# Altium integrated library Lib31082020.IntLib: 205 symbols (part 1 of 2)
Pins are listed as number, name and electrical type; pins without a type are passive.

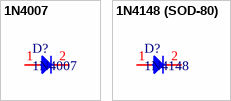
[diagram p0: symbols 1N4007 to 1N4148 (SOD-80)]

## 1N4007
designator D?
footprint DO-41
pins: 1, 2

## 1N4148 (SOD-80)
designator D?, comment 1N4148
footprint SOD-80
pins: 1, 2


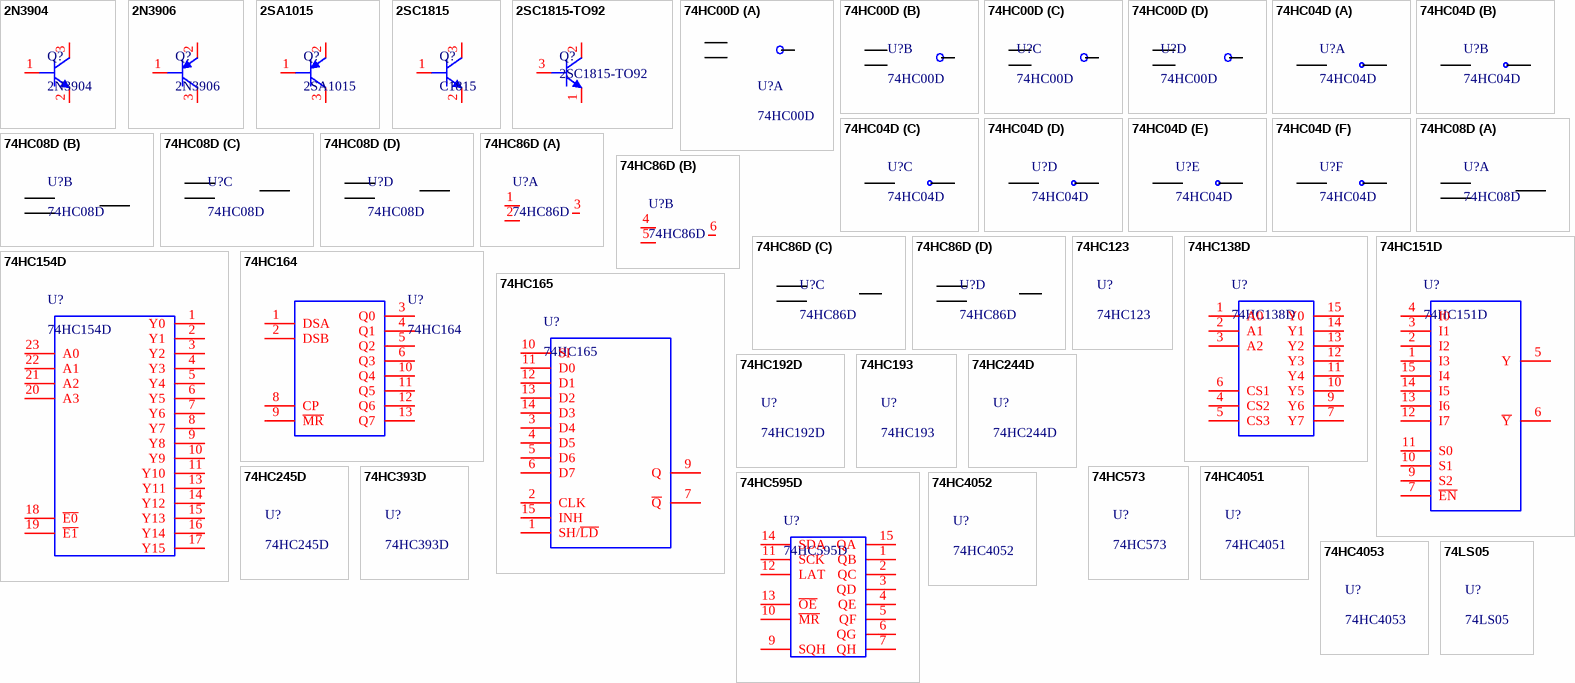
[diagram p1: symbols 2N3904 to 74LS05]

## 2N3904
designator Q?
footprint SOT23-3
footprint SOT223-3
pins: 1 B, 2 E, 3 C

## 2N3906
designator Q?
footprint SOT23-3
pins: 1 B, 2 E, 3 C

## 2SA1015
designator Q?
footprint SOT23-3
pins: 1 B, 2 E, 3 C

## 2SC1815
designator Q?, comment C1815
footprint SOT23-3
pins: 1 B, 2 E, 3 C

## 2SC1815-TO92
designator Q?
footprint TO-92
pins: 1 E, 2 C, 3 B

## 74HC00D
designator U?
footprint SO14
part A pins: 1, 2, 3, 7 hidden to GND, 14 hidden to VCC
part B pins: 4, 5, 6
part C pins: 8, 9, 10
part D pins: 11, 12, 13

## 74HC04D
designator U?
footprint SO14
part A pins: 1, 2, 7 hidden to GND, 14 hidden to VCC
part B pins: 3, 4
part C pins: 5, 6
part D pins: 8, 9
part E pins: 10, 11
part F pins: 12, 13

## 74HC08D
designator U?
footprint SO14
part A pins: 1, 2, 3
part B pins: 4, 5, 6, 7 hidden to GND, 14 hidden to VCC
part C pins: 8, 9, 10
part D pins: 11, 12, 13

## 74HC86D
designator U?
footprint SO14
part A pins: 1, 2, 3, 7 hidden to GND, 14 hidden to VCC
part B pins: 4, 5, 6
part C pins: 8, 9, 10
part D pins: 11, 12, 13

## 74HC123
designator U?
footprint SO16

## 74HC138D
designator U?
footprint SO16
pins: 1 A0, 2 A1, 3 A2, 4 CS2, 5 CS3, 6 CS1, 7 Y7, 8 hidden to GND, 9 Y6, 10 Y5, 11 Y4, 12 Y3, 13 Y2, 14 Y1, 15 Y0, 16 hidden to VCC

## 74HC151D
designator U?
footprint SO16
pins: 1 I3, 2 I2, 3 I1, 4 I0, 5 Y, 6 ~{Y}, 7 ~{EN}, 8 hidden to GND, 9 S2, 10 S1, 11 S0, 12 I7, 13 I6, 14 I5, 15 I4, 16 hidden to VCC

## 74HC154D
designator U?
footprint SO24
pins: 1 Y0, 2 Y1, 3 Y2, 4 Y3, 5 Y4, 6 Y5, 7 Y6, 8 Y7, 9 Y8, 10 Y9, 11 Y10, 12 hidden to GND, 13 Y11, 14 Y12, 15 Y13, 16 Y14, 17 Y15, 18 ~{E0}, 19 ~{E1}, 20 A3, 21 A2, 22 A1, 23 A0, 24 hidden to VCC

## 74HC164
designator U?
footprint SO14
pins: 1 DSA, 2 DSB, 3 Q0, 4 Q1, 5 Q2, 6 Q3, 7 hidden to GND, 8 CP, 9 ~{MR}, 10 Q4, 11 Q5, 12 Q6, 13 Q7, 14 hidden to VCC

## 74HC165
designator U?
footprint SO16
pins: 1 SH/~{LD}, 2 CLK, 3 D4, 4 D5, 5 D6, 6 D7, 7 ~{Q}, 8 hidden to GND, 9 Q, 10 SI, 11 D0, 12 D1, 13 D2, 14 D3, 15 INH, 16 hidden to VCC

## 74HC192D
designator U?
footprint SO16

## 74HC193
designator U?
footprint SO16

## 74HC244D
designator U?
footprint SO20

## 74HC245D
designator U?
footprint SOIC20_1.27_7.5

## 74HC393D
designator U?
footprint SO14

## 74HC573
designator U?
footprint SO20

## 74HC595D
designator U?
footprint SO16
pins: 1 QB, 2 QC, 3 QD, 4 QE, 5 QF, 6 QG, 7 QH, 8 hidden to GND, 9 SQH "OUTPUT", 10 ~{MR} "OUTPUT", 11 SCK "OUTPUT", 12 LAT "OUTPUT", 13 ~{OE} "OUTPUT", 14 SDA "OUTPUT", 15 QA, 16 hidden to VCC

## 74HC4051
designator U?
footprint SO16

## 74HC4052
designator U?
footprint SO16

## 74HC4053
designator U?
footprint SO16

## 74LS05
designator U?
footprint SO14

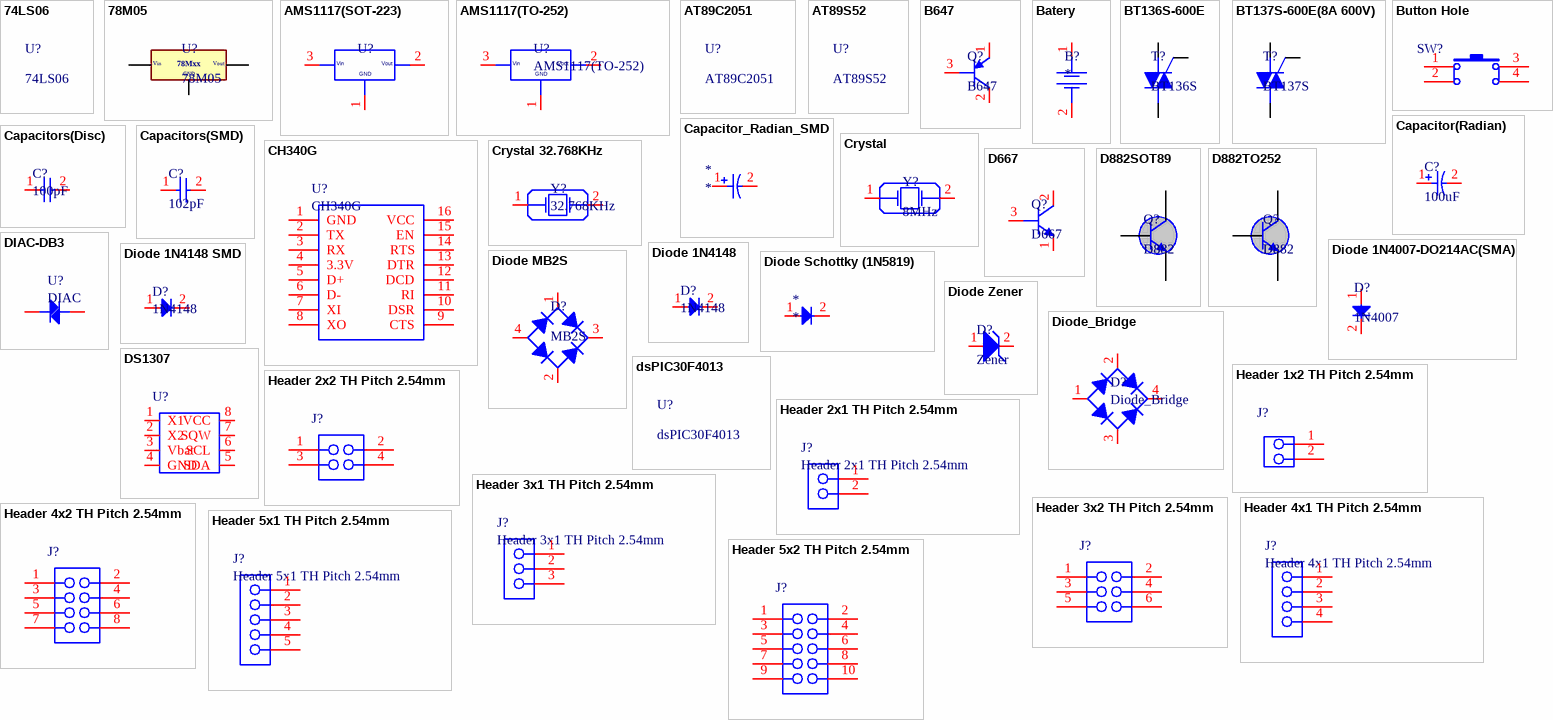
[diagram p2: symbols 74LS06 to Header 5x2 TH Pitch 2.54mm]

## 74LS06
designator U?
footprint SO14

## 78M05
designator U?
pins: 1, 2, 3
text: Vin; Vout; 78Mxx; GND

## AMS1117(SOT-223)
designator U?, comment AMS1117  (value not drawn)
footprint SOT223-3
pins: 1, 2, 3
text: Vin; Vout; GND

## AMS1117(TO-252)
designator U?
footprint TO252-3
pins: 1, 2, 3
text: Vin; Vout; GND

## AT89C2051
designator U?
footprint SOP20

## AT89S52
designator U?
footprint TQFP44_0.8_10

## B647
designator Q?
footprint TO-92
pins: 1 E, 2 C, 3 B

## Batery
designator B?
footprint CR1220
pins: 1, 2

## BT136S-600E
designator T?, comment BT136S
footprint TO252-3
pins: 1 T1, 2 T2, 3 G

## BT137S-600E(8A 600V)
designator T?, comment BT137S
footprint TO252-3
pins: 1 T1, 2 T2, 3 G

## Button Hole
designator SW?  (value not drawn)
footprint BUTTON_HOLE_4.3mm
footprint BUTTON_HOLE_5.0mm
footprint BUTTON_HOLE_7.0mm
footprint BUTTON_HOLE_7.3mm
footprint BUTTON_HOLE_7.5mm
footprint BUTTON_HOLE_8.0mm
footprint BUTTON_HOLE_9.5mm
footprint BUTTON_HOLE_11.0mm
footprint BUTTON_HOLE_12.0mm
footprint BUTTON_HOLE_13.0mm
footprint BUTTON_HOLE_15.0mm
footprint BUTTON_HOLE_17.0mm
footprint BUTTON_HOLE_18.0mm
footprint BUTTON_HOLE_20.0mm
footprint BUTTON_HOLE_22.0mm
footprint BUTTON_HOLE_26.0mm
pins: 1, 2, 3, 4

## Capacitor(Radian)
designator C?, comment 100uF
footprint CAP_6.3_100uF
footprint CAP_RAD_D5x11_POL_BK
footprint CAP_RAD_D6.3x11_POL_BK
footprint CAP_RAD_D8x11.5_POL_BK
footprint CAP_RAD_4mm
footprint CAP_RAD_7mm
footprint CAP_RAD_6mm
pins: 1, 2

## Capacitor_Radian_SMD
designator *
pins: 1, 2

## Capacitors(Disc)
designator C?, comment 100pF
footprint CAP_DISC_PITCH_2.54MM
pins: 1, 2

## Capacitors(SMD)
designator C?, comment 102pF
footprint C0201
footprint C0402
footprint C0603
footprint C0805
footprint C1206
footprint C1808
footprint C1812
pins: 1, 2

## CH340G
designator U?
footprint SOP16_1.27_3.8
pins: 1 GND, 2 TX, 3 RX, 4 3.3V, 5 D+, 6 D-, 7 XI, 8 XO, 9 CTS, 10 DSR, 11 RI, 12 DCD, 13 DTR, 14 RTS, 15 EN, 16 VCC

## Crystal
designator Y?, comment 8MHz
footprint HC-49S
footprint HC-49_THROUGH
footprint SMD5032
pins: 1, 2

## Crystal 32.768KHz
designator Y?, comment 32.768KHz
footprint DT-26
pins: 1, 2

## D667
designator Q?
footprint TO-92
pins: 1 E, 2 C, 3 B

## D882SOT89
designator Q?, comment D882
footprint SOT-89
pins: 1 B, 2 C, 3 E

## D882TO252
designator Q?, comment D882
footprint TO252-3
pins: 1 B, 2 C, 3 E

## DIAC-DB3
designator U?, comment DIAC
footprint SOT23-3
pins: 1 4, 2

## Diode 1N4007-DO214AC(SMA)
designator D?, comment 1N4007
footprint DO-214AC(SMA)
pins: 1, 2

## Diode 1N4148
designator D?, comment 1N4148
footprint DO-35 Horizontal
footprint DO-35 Vertical
footprint SOD-80
pins: 1, 2

## Diode 1N4148 SMD
designator D?, comment 1N4148
footprint DO-213AB
pins: 1, 2

## Diode MB2S
designator D?, comment MB2S
footprint TO-269AA
pins: 1, 2, 3, 4

## Diode Schottky (1N5819)
designator *
footprint SOD-123_2.7
pins: 1, 2

## Diode Zener
designator D?, comment Zener
footprint DO-213AB
pins: 1 A, 2 K

## Diode_Bridge
designator D?
footprint DIODE_2A
pins: 1, 2, 3, 4

## DS1307
designator U?, comment RealTime  (value not drawn)
footprint SOIC08_1.27_6.0
pins: 1 X1, 2 X2, 3 Vbat, 4 GND, 5 SDA, 6 SCL, 7 SQW, 8 VCC

## dsPIC30F4013
designator U?
footprint TQFP44_0.8_10

## Header 1x2 TH Pitch 2.54mm
designator J?  (value not drawn)
footprint Header 2x1 TH Pitch 2.54mm
pins: 1, 2

## Header 2x1 TH Pitch 2.54mm
designator J?
footprint Header 2x1 TH Pitch 2.54mm
pins: 1, 2

## Header 2x2 TH Pitch 2.54mm
designator J?  (value not drawn)
footprint Header 2x2 TH Pitch 2.54mm
pins: 1, 2, 3, 4

## Header 3x1 TH Pitch 2.54mm
designator J?
footprint Header 3x1 TH Pitch 2.54mm
pins: 1, 2, 3

## Header 3x2 TH Pitch 2.54mm
designator J?  (value not drawn)
footprint Header 3x2 TH Pitch 2.54mm
pins: 1, 2, 3, 4, 5, 6

## Header 4x1 TH Pitch 2.54mm
designator J?
footprint Header 4x1 TH Pitch 2.54mm
pins: 1, 2, 3, 4

## Header 4x2 TH Pitch 2.54mm
designator J?  (value not drawn)
footprint Header 4x2 TH Pitch 2.54mm
pins: 1, 2, 3, 4, 5, 6, 7, 8

## Header 5x1 TH Pitch 2.54mm
designator J?
footprint Header 5x1 TH Pitch 2.54mm
pins: 1, 2, 3, 4, 5

## Header 5x2 TH Pitch 2.54mm
designator J?  (value not drawn)
footprint Header 5x2 TH Pitch 2.54mm
pins: 1, 2, 3, 4, 5, 6, 7, 8, 9, 10

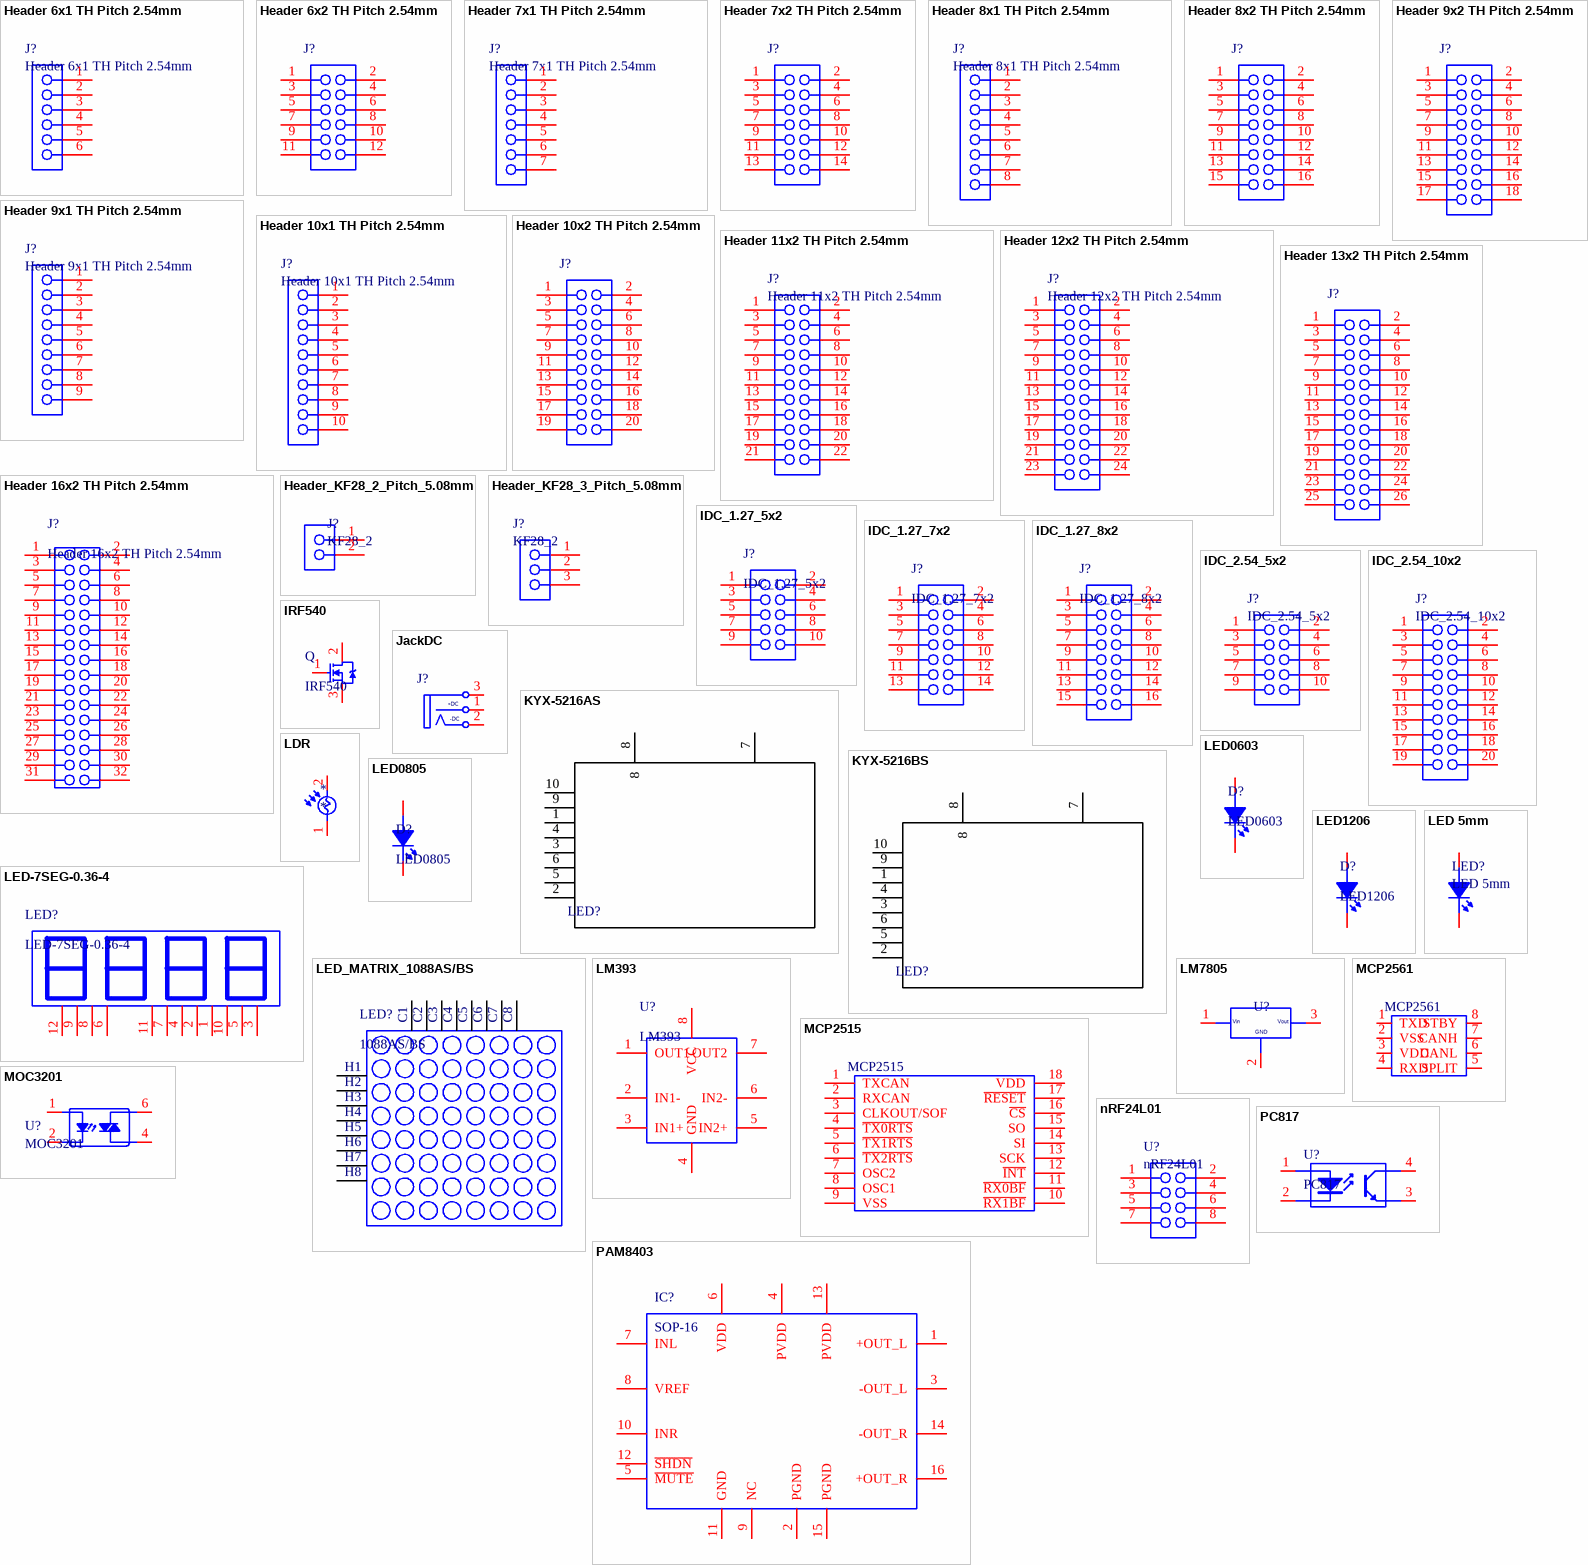
[diagram p3: symbols Header 6x1 TH Pitch 2.54mm to PC817]

## Header 6x1 TH Pitch 2.54mm
designator J?
footprint Header 6x1 TH Pitch 2.54mm
pins: 1, 2, 3, 4, 5, 6

## Header 6x2 TH Pitch 2.54mm
designator J?  (value not drawn)
footprint Header 6x2 TH Pitch 2.54mm
pins: 1, 2, 3, 4, 5, 6, 7, 8, 9, 10, 11, 12

## Header 7x1 TH Pitch 2.54mm
designator J?
footprint Header 7x1 TH Pitch 2.54mm
pins: 1, 2, 3, 4, 5, 6, 7

## Header 7x2 TH Pitch 2.54mm
designator J?  (value not drawn)
footprint Header 7x2 TH Pitch 2.54mm
pins: 1, 2, 3, 4, 5, 6, 7, 8, 9, 10, 11, 12, 13, 14

## Header 8x1 TH Pitch 2.54mm
designator J?
footprint Header 8x1 TH Pitch 2.54mm
pins: 1, 2, 3, 4, 5, 6, 7, 8

## Header 8x2 TH Pitch 2.54mm
designator J?  (value not drawn)
footprint Header 8x2 TH Pitch 2.54mm
pins: 1, 2, 3, 4, 5, 6, 7, 8, 9, 10, 11, 12, 13, 14, 15, 16

## Header 9x1 TH Pitch 2.54mm
designator J?
footprint Header 9x1 TH Pitch 2.54mm
pins: 1, 2, 3, 4, 5, 6, 7, 8, 9

## Header 9x2 TH Pitch 2.54mm
designator J?  (value not drawn)
footprint Header 9x2 TH Pitch 2.54mm
pins: 1, 2, 3, 4, 5, 6, 7, 8, 9, 10, 11, 12, 13, 14, 15, 16, 17, 18

## Header 10x1 TH Pitch 2.54mm
designator J?
footprint Header 10x1 TH Pitch 2.54mm
pins: 1, 2, 3, 4, 5, 6, 7, 8, 9, 10

## Header 10x2 TH Pitch 2.54mm
designator J?  (value not drawn)
footprint Header 10x2 TH Pitch 2.54mm
pins: 1, 2, 3, 4, 5, 6, 7, 8, 9, 10, 11, 12, 13, 14, 15, 16, 17, 18, 19, 20

## Header 11x2 TH Pitch 2.54mm
designator J?
footprint Header 11x2 TH Pitch 2.54mm
pins: 1, 2, 3, 4, 5, 6, 7, 8, 9, 10, 11, 12, 13, 14, 15, 16, 17, 18, 19, 20, 21, 22

## Header 12x2 TH Pitch 2.54mm
designator J?
footprint Header 12x2 TH Pitch 2.54mm
pins: 1, 2, 3, 4, 5, 6, 7, 8, 9, 10, 11, 12, 13, 14, 15, 16, 17, 18, 19, 20, 21, 22, 23, 24

## Header 13x2 TH Pitch 2.54mm
designator J?  (value not drawn)
footprint Header 13x2 TH Pitch 2.54mm
pins: 1, 2, 3, 4, 5, 6, 7, 8, 9, 10, 11, 12, 13, 14, 15, 16, 17, 18, 19, 20, 21, 22, 23, 24, 25, 26

## Header 16x2 TH Pitch 2.54mm
designator J?
footprint Header 16x2 TH Pitch 2.54mm
pins: 1, 2, 3, 4, 5, 6, 7, 8, 9, 10, 11, 12, 13, 14, 15, 16, 17, 18, 19, 20, 21, 22, 23, 24, 25, 26, 27, 28, 29, 30, 31, 32

## Header_KF28_2_Pitch_5.08mm
designator J?, comment KF28_2
footprint HEADER_KF128_2_5.08MM
pins: 1, 2

## Header_KF28_3_Pitch_5.08mm
designator J?, comment KF28_2
footprint HEADER_KF128_3_5.08MM
pins: 1, 2, 3

## IDC_1.27_5x2
designator J?
footprint CONB127P-2R-10W_TH
pins: 1, 2, 3, 4, 5, 6, 7, 8, 9, 10

## IDC_1.27_7x2
designator J?
footprint CONB127P-2R-14W_TH
pins: 1, 2, 3, 4, 5, 6, 7, 8, 9, 10, 11, 12, 13, 14

## IDC_1.27_8x2
designator J?
footprint CONB127P-2R-16W_TH
pins: 1, 2, 3, 4, 5, 6, 7, 8, 9, 10, 11, 12, 13, 14, 15, 16

## IDC_2.54_5x2
designator J?
footprint IDC_CONNECTOR_10x2.54
pins: 1, 2, 3, 4, 5, 6, 7, 8, 9, 10

## IDC_2.54_10x2
designator J?
footprint IDC_CONNECTOR_20_2.54
pins: 1, 2, 3, 4, 5, 6, 7, 8, 9, 10, 11, 12, 13, 14, 15, 16, 17, 18, 19, 20

## IRF540
designator Q
footprint TO263AB
pins: 1 G, 2 D, 3 S

## JackDC
designator J?, comment Connector  (value not drawn)
footprint DC_JACK_161-0721
footprint DC_K375A_Power
pins: 1 DS+ (power) "Sleeve (Ground)", 2 DC- "Tip Normal (Break Contact)", 3 T "Tip"
text: +DC; -DC

## KYX-5216AS
designator LED?  (value not drawn)
footprint KYX-5261AS/BS (0.56inch 2digits red 7 segment led display 10pin)
pins: 1, 2, 3, 4, 5, 6, 7, 8, 9, 10

## KYX-5216BS
designator LED?
footprint KYX-5261AS/BS (0.56inch 2digits red 7 segment led display 10pin)
pins: 1, 2, 3, 4, 5, 6, 7, 8, 9, 10

## LDR
designator *
footprint LDR_CELL_THRU_HOLE
pins: 1, 2

## LED0603
designator D?
footprint L0603BLUE
pins: 1 A, 2 K

## LED0805
designator D?
footprint L0805RED
pins: 1 A, 2 K

## LED1206
designator D?
footprint L1206BLUE
footprint L1206RED
pins: 1 A, 2 K

## LED 5mm
designator LED?
footprint LED_5MM
pins: 1 A, 2 K

## LED-7SEG-0.36-4
designator LED?
footprint LED-7SEG-0.36-4
pins: 1, 2, 3, 4, 5, 6, 7, 8, 9, 10, 11, 12

## LED_MATRIX_1088AS/BS
designator LED?, comment 1088AS/BS
footprint LED_MATRIX_1088AS/BS
pins: 1, 2, 3, 4, 5, 6, 7, 8, 9, 10, 11, 12, 13, 14, 15, 16
text: C1; C2; C3; C4; C5; C6; C7; C8; H1; H2; H3; H4; H5; H6; H7; H8

## LM393
designator U?
footprint SOIC08_1.27_6.0
pins: 1 OUT1, 2 IN1-, 3 IN1+, 4 GND, 5 IN2+, 6 IN2-, 7 OUT2, 8 VCC

## LM7805
designator U?  (value not drawn)
footprint TO252-3
pins: 1, 2, 3 2
text: Vin; Vout; GND

## MCP2515
designator MCP2515, comment Stand-Alone CAN Controller with SPI Interface  (value not drawn)
footprint SOIC18_1.27_7.5
pins: 1 TXCAN, 2 RXCAN, 3 CLKOUT/SOF, 4 ~{TX0RTS}, 5 ~{TX1RTS}, 6 ~{TX2RTS}, 7 OSC2, 8 OSC1, 9 VSS, 10 ~{RX1BF}, 11 ~{RX0BF}, 12 ~{INT}, 13 SCK, 14 SI, 15 SO, 16 ~{CS}, 17 ~{RESET}, 18 VDD

## MCP2561
designator MCP2561, comment High-Speed CAN Transceiver  (value not drawn)
footprint SOIC08_1.27_6.0
pins: 1 TXD, 2 VSS, 3 VDD, 4 RXD, 5 SPLIT, 6 CANL, 7 CANH, 8 STBY

## MOC3201
designator U?
footprint SOP-6
pins: 1, 2, 4, 6

## nRF24L01
designator U?
footprint nRF24L01
pins: 1, 2, 3, 4, 5, 6, 7, 8

## PAM8403
designator IC?, comment SOP-16
footprint SOP16_1.27_3.8
pins: 1 +OUT_L, 2 PGND, 3 -OUT_L, 4 PVDD, 5 ~{MUTE}, 6 VDD, 7 INL, 8 VREF, 9 NC, 10 INR, 11 GND, 12 ~{SHDN}, 13 PVDD, 14 -OUT_R, 15 PGND, 16 +OUT_R

## PC817
designator U?
footprint SOP-4
pins: 1 A "Anode", 2 K "Cathode", 3 E "Emitter", 4 C "Collector"

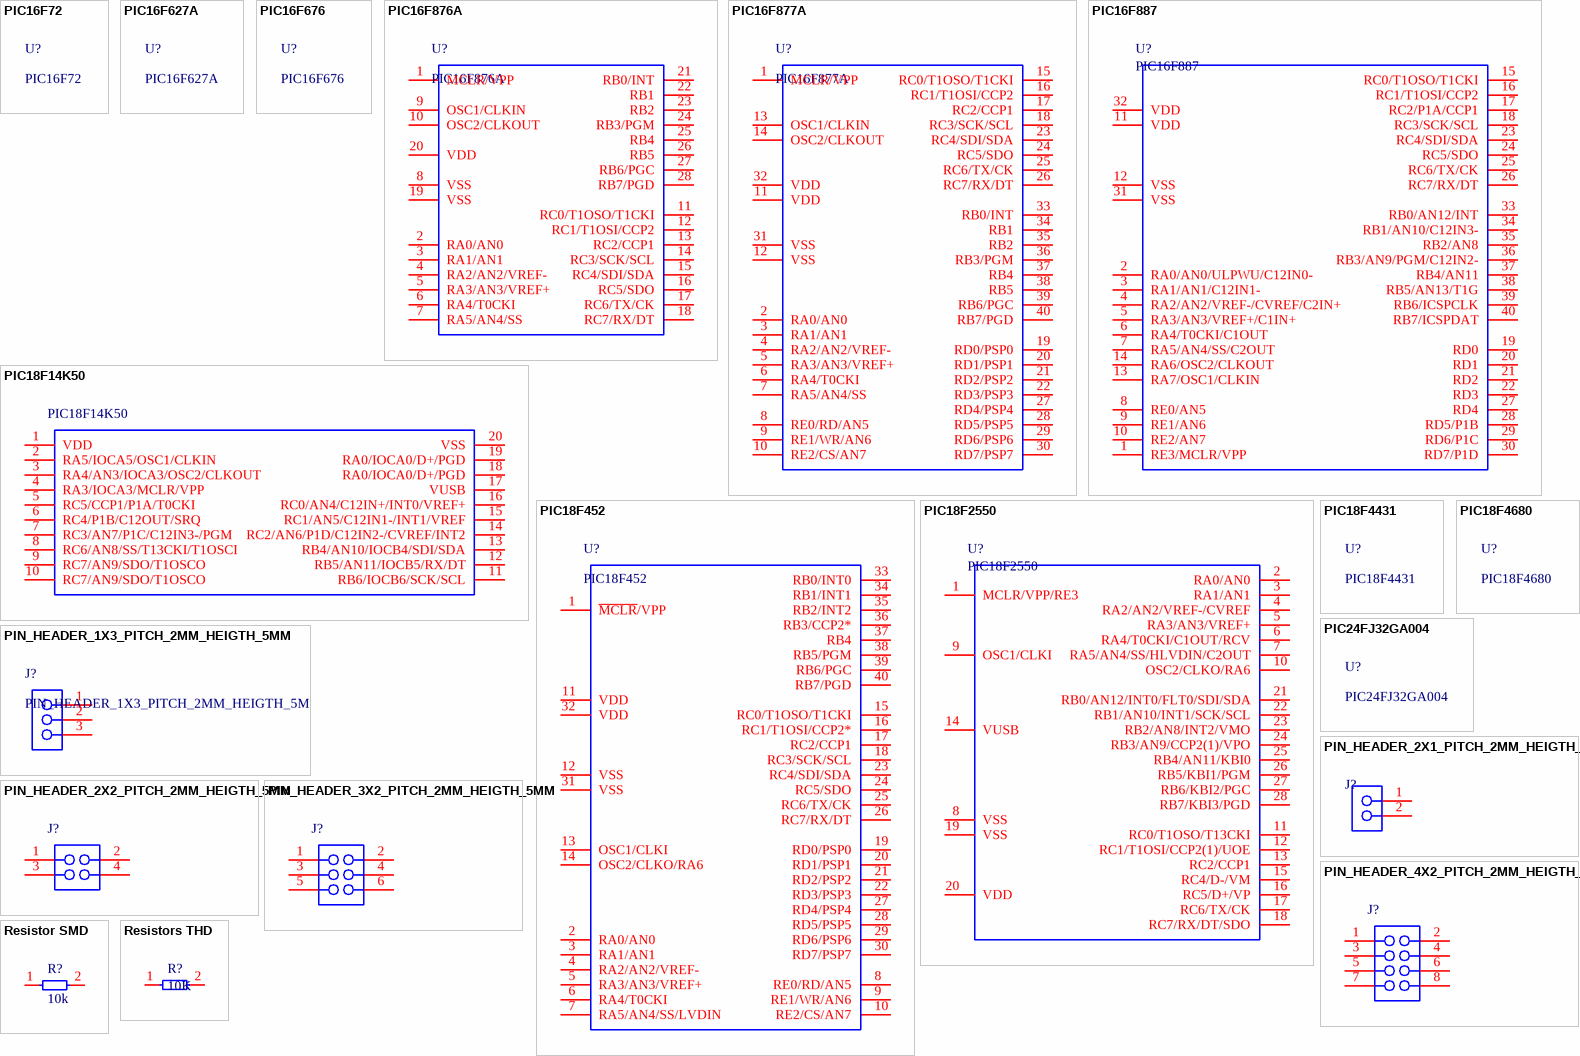
[diagram p4: symbols PIC16F72 to Resistors THD]

## PIC16F72
designator U?
footprint SSOP28

## PIC16F627A
designator U?

## PIC16F676
designator U?
footprint TSSOP14_0.65_4.4

## PIC16F876A
designator U?
footprint SSOP28
footprint DIP28_M04
pins: 1 MCLR/VPP, 2 RA0/AN0, 3 RA1/AN1, 4 RA2/AN2/VREF-, 5 RA3/AN3/VREF+, 6 RA4/T0CKI, 7 RA5/AN4/SS, 8 VSS, 9 OSC1/CLKIN, 10 OSC2/CLKOUT, 11 RC0/T1OSO/T1CKI, 12 RC1/T1OSI/CCP2, 13 RC2/CCP1, 14 RC3/SCK/SCL, 15 RC4/SDI/SDA, 16 RC5/SDO, 17 RC6/TX/CK, 18 RC7/RX/DT, 19 VSS, 20 VDD, 21 RB0/INT, 22 RB1, 23 RB2, 24 RB3/PGM, 25 RB4, 26 RB5, 27 RB6/PGC, 28 RB7/PGD

## PIC16F877A
designator U?
footprint DIP40_M02
pins: 1 MCLR/VPP, 2 RA0/AN0, 3 RA1/AN1, 4 RA2/AN2/VREF-, 5 RA3/AN3/VREF+, 6 RA4/T0CKI, 7 RA5/AN4/SS, 8 RE0/RD/AN5, 9 RE1/WR/AN6, 10 RE2/CS/AN7, 11 VDD, 12 VSS, 13 OSC1/CLKIN, 14 OSC2/CLKOUT, 15 RC0/T1OSO/T1CKI, 16 RC1/T1OSI/CCP2, 17 RC2/CCP1, 18 RC3/SCK/SCL, 19 RD0/PSP0, 20 RD1/PSP1, 21 RD2/PSP2, 22 RD3/PSP3, 23 RC4/SDI/SDA, 24 RC5/SDO, 25 RC6/TX/CK, 26 RC7/RX/DT, 27 RD4/PSP4, 28 RD5/PSP5, 29 RD6/PSP6, 30 RD7/PSP7, 31 VSS, 32 VDD, 33 RB0/INT, 34 RB1, 35 RB2, 36 RB3/PGM, 37 RB4, 38 RB5, 39 RB6/PGC, 40 RB7/PGD

## PIC16F887
designator U?
footprint DIP40_M02
pins: 1 RE3/MCLR/VPP, 2 RA0/AN0/ULPWU/C12IN0-, 3 RA1/AN1/C12IN1-, 4 RA2/AN2/VREF-/CVREF/C2IN+, 5 RA3/AN3/VREF+/C1IN+, 6 RA4/T0CKI/C1OUT, 7 RA5/AN4/SS/C2OUT, 8 RE0/AN5, 9 RE1/AN6, 10 RE2/AN7, 11 VDD, 12 VSS, 13 RA7/OSC1/CLKIN, 14 RA6/OSC2/CLKOUT, 15 RC0/T1OSO/T1CKI, 16 RC1/T1OSI/CCP2, 17 RC2/P1A/CCP1, 18 RC3/SCK/SCL, 19 RD0, 20 RD1, 21 RD2, 22 RD3, 23 RC4/SDI/SDA, 24 RC5/SDO, 25 RC6/TX/CK, 26 RC7/RX/DT, 27 RD4, 28 RD5/P1B, 29 RD6/P1C, 30 RD7/P1D, 31 VSS, 32 VDD, 33 RB0/AN12/INT, 34 RB1/AN10/C12IN3-, 35 RB2/AN8, 36 RB3/AN9/PGM/C12IN2-, 37 RB4/AN11, 38 RB5/AN13/T1G, 39 RB6/ICSPCLK, 40 RB7/ICSPDAT

## PIC18F14K50
designator PIC18F14K50
footprint SOIC20_1.27_7.5
pins: 1 VDD, 2 RA5/IOCA5/OSC1/CLKIN, 3 RA4/AN3/IOCA3/OSC2/CLKOUT, 4 RA3/IOCA3/MCLR/VPP, 5 RC5/CCP1/P1A/T0CKI, 6 RC4/P1B/C12OUT/SRQ, 7 RC3/AN7/P1C/C12IN3-/PGM, 8 RC6/AN8/SS/T13CKI/T1OSCI, 9 RC7/AN9/SDO/T1OSCO, 10 RC7/AN9/SDO/T1OSCO, 11 RB6/IOCB6/SCK/SCL, 12 RB5/AN11/IOCB5/RX/DT, 13 RB4/AN10/IOCB4/SDI/SDA, 14 RC2/AN6/P1D/C12IN2-/CVREF/INT2, 15 RC1/AN5/C12IN1-/INT1/VREF, 16 RC0/AN4/C12IN+/INT0/VREF+, 17 VUSB, 18 RA0/IOCA0/D+/PGD, 19 RA0/IOCA0/D+/PGD, 20 VSS

## PIC18F452
designator U?
footprint TQFP44_0.8_10
footprint DIP40_M02
pins: 1 ~{MCLR}/VPP, 2 RA0/AN0, 3 RA1/AN1, 4 RA2/AN2/VREF-, 5 RA3/AN3/VREF+, 6 RA4/T0CKI, 7 RA5/AN4/SS/LVDIN, 8 RE0/RD/AN5, 9 RE1/WR/AN6, 10 RE2/CS/AN7, 11 VDD, 12 VSS, 13 OSC1/CLKI, 14 OSC2/CLKO/RA6, 15 RC0/T1OSO/T1CKI, 16 RC1/T1OSI/CCP2*, 17 RC2/CCP1, 18 RC3/SCK/SCL, 19 RD0/PSP0, 20 RD1/PSP1, 21 RD2/PSP2, 22 RD3/PSP3, 23 RC4/SDI/SDA, 24 RC5/SDO, 25 RC6/TX/CK, 26 RC7/RX/DT, 27 RD4/PSP4, 28 RD5/PSP5, 29 RD6/PSP6, 30 RD7/PSP7, 31 VSS, 32 VDD, 33 RB0/INT0, 34 RB1/INT1, 35 RB2/INT2, 36 RB3/CCP2*, 37 RB4, 38 RB5/PGM, 39 RB6/PGC, 40 RB7/PGD

## PIC18F2550
designator U?
footprint DIP28_M04
pins: 1 MCLR/VPP/RE3, 2 RA0/AN0, 3 RA1/AN1, 4 RA2/AN2/VREF-/CVREF, 5 RA3/AN3/VREF+, 6 RA4/T0CKI/C1OUT/RCV, 7 RA5/AN4/SS/HLVDIN/C2OUT, 8 VSS, 9 OSC1/CLKI, 10 OSC2/CLKO/RA6, 11 RC0/T1OSO/T13CKI, 12 RC1/T1OSI/CCP2(1)/UOE, 13 RC2/CCP1, 14 VUSB, 15 RC4/D-/VM, 16 RC5/D+/VP, 17 RC6/TX/CK, 18 RC7/RX/DT/SDO, 19 VSS, 20 VDD, 21 RB0/AN12/INT0/FLT0/SDI/SDA, 22 RB1/AN10/INT1/SCK/SCL, 23 RB2/AN8/INT2/VMO, 24 RB3/AN9/CCP2(1)/VPO, 25 RB4/AN11/KBI0, 26 RB5/KBI1/PGM, 27 RB6/KBI2/PGC, 28 RB7/KBI3/PGD

## PIC18F4431
designator U?
footprint TQFP44_0.8_10

## PIC18F4680
designator U?
footprint TQFP44_0.8_10

## PIC24FJ32GA004
designator U?
footprint TQFP44_0.8_10

## PIN_HEADER_1X3_PITCH_2MM_HEIGTH_5MM
designator J?
footprint PIN_HEADER_1X3_PITCH_2MM_HEIGTH_5MM
pins: 1, 2, 3

## PIN_HEADER_2X1_PITCH_2MM_HEIGTH_5MM
designator J?  (value not drawn)
footprint PIN_HEADER_2X1_PITCH_2MM_HEIGTH_5MM
pins: 1, 2

## PIN_HEADER_2X2_PITCH_2MM_HEIGTH_5MM
designator J?  (value not drawn)
footprint PIN_HEADER_2X2_PITCH_2MM_HEIGTH_5MM
pins: 1, 2, 3, 4

## PIN_HEADER_3X2_PITCH_2MM_HEIGTH_5MM
designator J?  (value not drawn)
footprint PIN_HEADER_3X2_PITCH_2MM_HEIGTH_5MM
pins: 1, 2, 3, 4, 5, 6

## PIN_HEADER_4X2_PITCH_2MM_HEIGTH_5MM
designator J?  (value not drawn)
footprint PIN_HEADER_4X2_PITCH_2MM_HEIGTH_5MM
pins: 1, 2, 3, 4, 5, 6, 7, 8

## Resistor SMD
designator R?, comment 10k
footprint R0603
footprint R0805
footprint R1206
footprint R2010
footprint R2512
pins: 1, 2

## Resistors THD
designator R?, comment 10K
footprint RES-0.125W-H-CF
footprint RES-0.125W-H-MF
footprint RES-0.125W-V-CF
footprint RES-0.125W-V-MF
footprint RES-0.25W-H-CF
footprint RES-0.25W-H-MF
footprint RES-0.25W-V-CF
footprint RES-0.25W-V-MF
footprint RES-0.5W-H-MF
footprint RES-0.5W-H-MF
footprint RES-0.5W-V-MF
footprint RES-0.5W-V-MO
footprint RES-0.5W-HH-MF
footprint RES-0.5W-HH-MO
pins: 1, 2
